# Altium footprint library THU VIEN PCB.PCBLib: 911 footprints (part 5 of 57)
Each footprint in its own frame and in the unit in brackets; x right, y up, seen from the top. Pads: shape width x height; smd on the part's side, far side on the other; paste and mask are expansions set on the pad; w line width, h text height; cw(c..) or ccw(c..) is an arc to the next point about the centre after c.
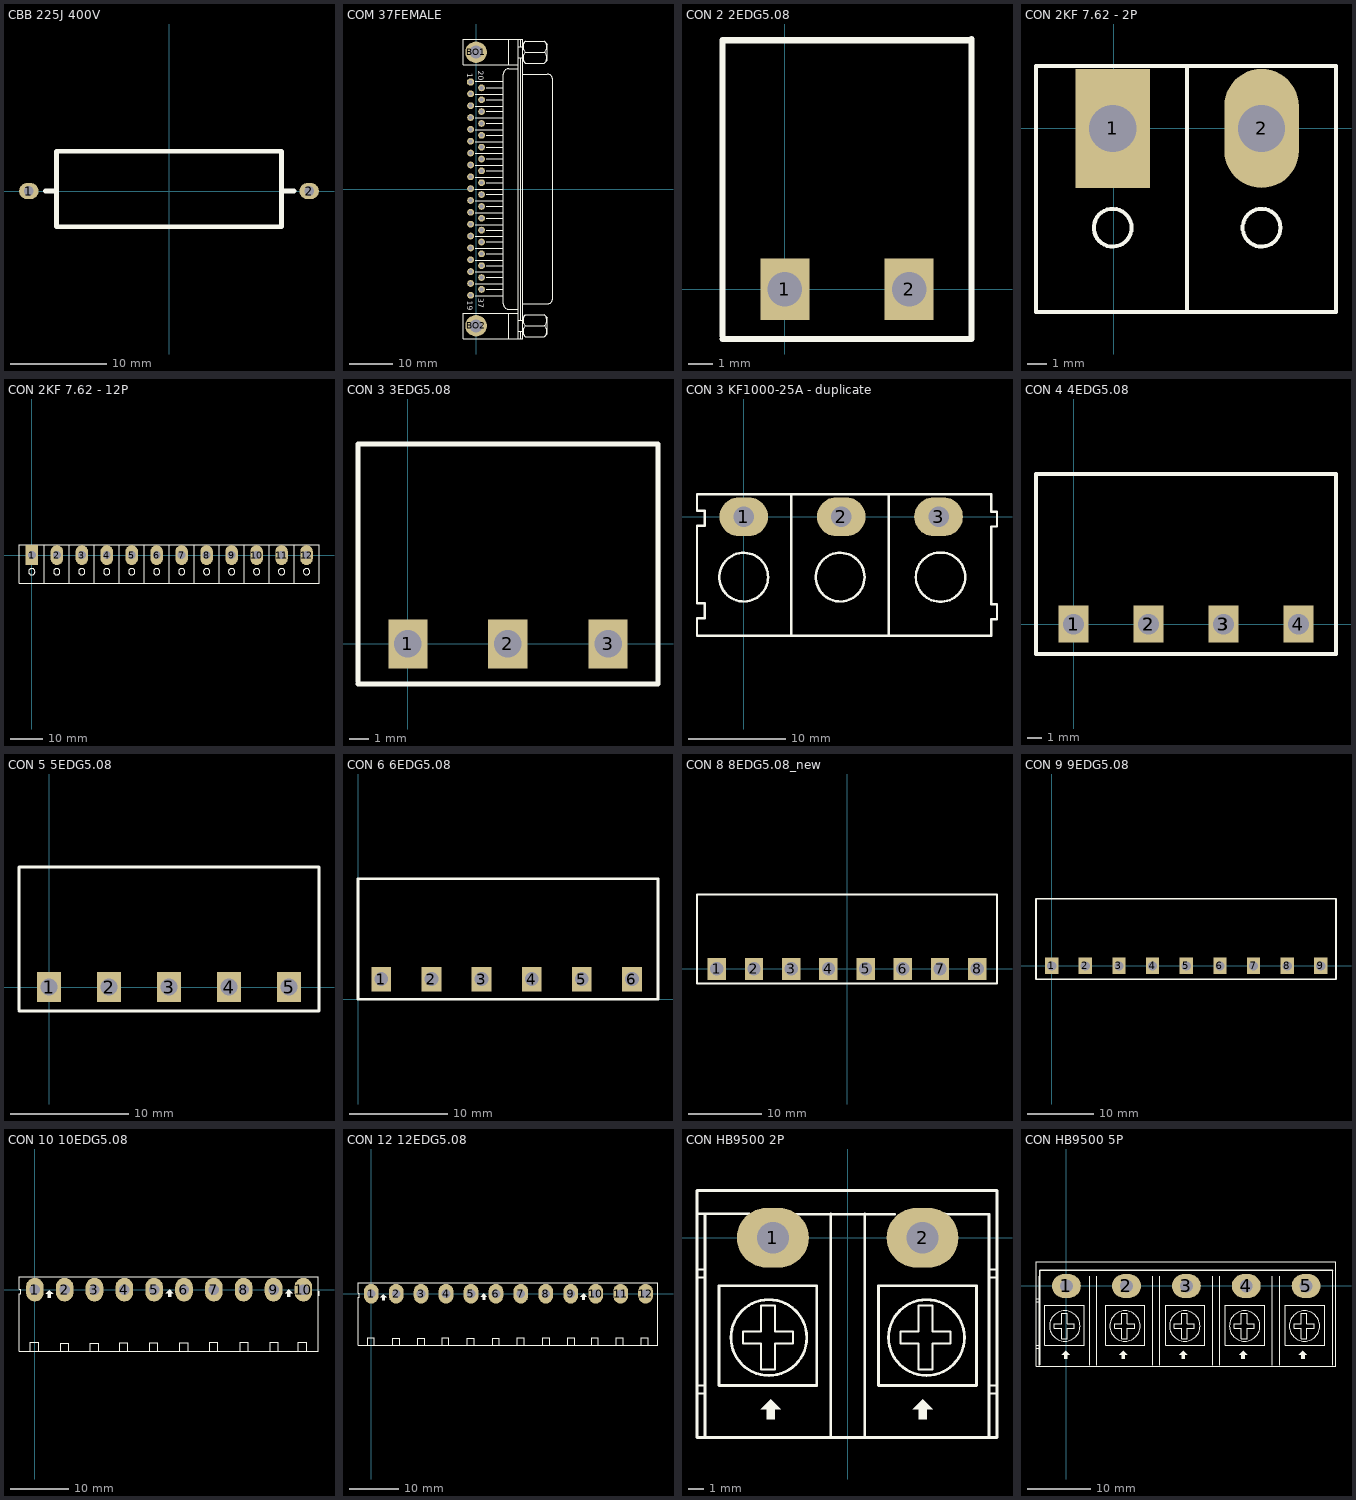
[diagram p4: the footprints below, top view; thin cyan lines are the x and y axes]

## CBB 225J 400V [mil]
pads (2):
  oval 80x65 hole 40: 1(-573.5,0) 2(573.5,0)
Top Overlay:
  lines w20: -504.5,1 -460.5,1 ; 462.5,0 510.5,0 ; -459.9,-146 -459.9,163 460.5,163 460.5,-146 -459.9,-146

## COM 37FEMALE [mil] "COM 37"
pads (39):
  oct 62x62 hole 35: 1(-50,978.33)
  round 62 hole 35: 2(-50,870) 3(-50,761.67) 4(-50,653.33) 5(-50,545) 6(-50,436.67) 7(-50,328.33) 8(-50,220) 9(-50,111.67) 10(-50,3.33) 11(-50,-105) 12(-50,-213.33) 13(-50,-321.67) 14(-50,-430) 15(-50,-538.33) 16(-50,-646.67) 17(-50,-755) 18(-50,-863.33) 19(-50,-971.67) 20(50,924.17) 21(50,815.83) 22(50,707.5) 23(50,599.17) 24(50,490.83) 25(50,382.5) 26(50,274.17) 27(50,165.83) 28(50,57.5) 29(50,-50.83) 30(50,-159.17) 31(50,-267.5) 32(50,-375.83) 33(50,-484.17) 34(50,-592.5) 35(50,-700.83) 36(50,-809.17) 37(50,-917.5)
  round 196.67 hole 118.33: BO1(0,1250) BO2(0,-1250)
Top Overlay:
  lines w8: -8.33,-975 241.67,-975 250,-975 ; -8.33,-866.67 241.67,-866.67 250,-866.67 ; -8.33,-758.33 241.67,-758.33 250,-758.33 ; -8.33,-650 241.67,-650 250,-650 ; -8.33,-541.67 241.67,-541.67 250,-541.67 ; -8.33,-433.33 241.67,-433.33 250,-433.33 ; -8.33,-325 241.67,-325 250,-325 ; -8.33,-216.67 241.67,-216.67 250,-216.67 ; -8.33,-108.33 250,-108.33 ; -8.33,0 250,0 ; -8.33,108.33 241.67,108.33 250,108.33 ; -8.33,216.67 241.67,216.67 250,216.67 ; -8.33,325 241.67,325 250,325 ; -8.33,433.33 241.67,433.33 250,433.33 ; -8.33,541.67 241.67,541.67 250,541.67 ; -8.33,650 241.67,650 250,650 ; -8.33,758.33 241.67,758.33 250,758.33 ; -8.33,866.67 241.67,866.67 250,866.67 ; -8.33,983.33 250,983.33 ; 91.67,-916.67 250,-916.67 ; 91.67,-808.33 250,-808.33 ; 91.67,-700 250,-700 ; 91.67,-591.67 250,-591.67 ; 91.67,-483.33 250,-483.33 ; 91.67,-375 250,-375 ; 91.67,-266.67 250,-266.67 ; 91.67,-158.33 250,-158.33 ; 91.67,-50 250,-50 ; 91.67,58.33 250,58.33 ; 91.67,166.67 250,166.67 ; 91.67,275 250,275 ; 91.67,383.33 250,383.33 ; 91.67,491.67 250,491.67 ; 91.67,600 250,600 ; 91.67,708.33 250,708.33 ; 91.67,816.67 250,816.67 ; 91.67,925 250,925 ; 300,-1366.67 300,-1133.33 ; 300,1133.33 300,1366.67 ; 383.33,-1366.67 383.33,1366.67 ; 383.33,-1300 425,-1300 ; 383.33,-1200 425,-1200 ; 383.33,-1133.33 -116.67,-1133.33 -116.67,-1366.67 425,-1366.67 425,1366.67 -116.67,1366.67 -116.67,1133.33 383.33,1133.33 ; 383.33,-1100 300,-1100 cw(c300,-1050) 250,-1050 250,1050 cw(c300,1050) 300,1100 383.33,1100 ; 383.33,1200 425,1200 ; 383.33,1300 425,1300 ; 408.33,-1366.67 408.33,-1300 ; 408.33,-1200 408.33,1200 ; 408.33,1300 408.33,1366.67 ; 425,-1325 450,-1350 625,-1350 650,-1325 650,-1175 625,-1150 450,-1150 425,-1175 ; 425,-1050 650,-1050 ccw(c650,-1000) 700,-1000 700,1000 ccw(c650,1000) 650,1050 425,1050 ; 425,1175 450,1150 625,1150 650,1175 650,1325 625,1350 450,1350 425,1325 ; 449.91,-1350.09 cw(c500,-1300) 449.91,-1249.91 ; 449.91,-1250.09 cw(c500,-1200) 449.91,-1149.91 ; 449.91,1149.91 cw(c500,1200) 449.91,1250.09 ; 449.91,1249.91 cw(c500,1300) 449.91,1350.09 ; 450,-1250 625,-1250 ; 450,1250 625,1250 ; 625.09,-1350.09 ccw(c575,-1300) 625.09,-1249.91 ; 625.09,-1250.09 ccw(c575,-1200) 625.09,-1149.91 ; 625.09,1149.91 ccw(c575,1200) 625.09,1250.09 ; 625.09,1249.91 ccw(c575,1300) 625.09,1350.09
  text "20" at 20,1080 h50
  text "19" at -80,-1020 h50
  text "37" at 20,-1000 h50
  text "1" at -80,1060 h50

## CON 2 2EDG5.08 [mm]
pads (2):
  rect 2x2.5 hole 1.4: 1(0,0) 2(5.08,0)
Top Overlay:
  lines w0.254: -2.54,-2.032 7.62,-2.032 7.62,10.211 ; -2.54,-1.905 -2.54,10.173 ; -2.54,10.16 7.62,10.16
3D body "User Library-BigHeader 5EHDR_1P.step": height 3.15, standoff -9.32, extent 2.58,-1.75 7.58,10.25
3D body "User Library-BigHeader 5EHDR_1P.step": height 3.15, standoff -9.32, extent -2.5,-1.75 2.5,10.25

## CON 2KF 7.62 - 2P [mil]
pads (2):
  rect 150x240 hole 95: 1(-2,0)
  oval 150x240 hole 95: 2(298,0)
Top Overlay:
  circle w8: c-2,-200 r38.08
  circle w8: c298,-200 r38.08
  lines w7.87: 148,-368.06 148,126 ; -156.54,-370 -156.54,-339.27 -156.54,126 448,126 448,-370 -156.54,-370
3D body "Con 2 KF7.62.step": height 492.61, standoff -245.58, extent -152,-370 448,122.12

## CON 2KF 7.62 - 12P [mil]
pads (12):
  rect 150x240 hole 95: 1(0,0)
  oval 150x240 hole 95: 2(300,0) 3(600,0) 4(900,0) 5(1200,0) 6(1500,0) 7(1800,0) 8(2100,0) 9(2400,0) 10(2700,0) 11(3000,0) 12(3300,0)
Top Overlay:
  circle w8: c0,-200 r38.08
  circle w8: c300,-200 r38.08
  circle w8: c3300,-200 r38.08
  circle w8: c3000,-200 r38.08
  circle w8: c2700,-200 r38.08
  circle w8: c2400,-200 r38.08
  circle w8: c2100,-200 r38.08
  circle w8: c1800,-200 r38.08
  circle w8: c1500,-200 r38.08
  circle w8: c1200,-200 r38.08
  circle w8: c900,-200 r38.08
  circle w8: c600,-200 r38.08
  lines w7.87: 150,-340.06 150,125 ; 450,-340.06 450,125 ; 454.7,125 -154.54,125 -154.54,-339.27 -154.54,-339.67 3450,-339.67 3450,125 455.12,125 ; 750,-340.06 750,125 ; 1050,-340.06 1050,125 ; 1350,-340.06 1350,125 ; 1650,-340.06 1650,125 ; 1950,-340.06 1950,125 ; 2250,-340.06 2250,125 ; 2550,-340.06 2550,125 ; 2850,-340.06 2850,125 ; 3150,-340.06 3150,125
3D body "Con 2 KF7.62.step": height 492.61, standoff -245.58, extent -150,-370 450,122.12
3D body "Con 2 KF7.62.step": height 492.61, standoff -245.58, extent 450,-370 1050,122.12
3D body "Con 2 KF7.62.step": height 492.61, standoff -245.58, extent 2850,-370 3450,122.12
3D body "Con 2 KF7.62.step": height 492.61, standoff -245.58, extent 2250,-370 2850,122.12
3D body "Con 2 KF7.62.step": height 492.61, standoff -245.58, extent 1650,-370 2250,122.12
3D body "Con 2 KF7.62.step": height 492.61, standoff -245.58, extent 1050,-370 1650,122.12

## CON 3 3EDG5.08 [mm]
pads (3):
  rect 2x2.5 hole 1.4: 1(0,0) 2(5.08,0) 3(10.173,0)
Top Overlay:
  lines w0.254: -2.54,-2.032 12.713,-2.032 12.713,10.16 -2.54,10.16 -2.54,-1.905
3D body "User Library-BigHeader 5EHDR_1P.step": height 3.15, standoff -9.32, extent -2.5,-1.75 2.5,10.25
3D body "User Library-BigHeader 5EHDR_1P.step": height 3.15, standoff -9.32, extent 2.593,-1.75 7.593,10.25
3D body "User Library-BigHeader 5EHDR_1P.step": height 3.15, standoff -9.32, extent 7.673,-1.75 12.673,10.25

## CON 3 KF1000-25A - duplicate [mm]
pads (3):
  oval 5x4 hole 2.1: 1(0,0) 2(10,0) 3(20,0)
Top Overlay:
  circle w0.254: c0,-6.2 r2.5
  circle w0.254: c9.9,-6.2 r2.5
  circle w0.254: c20.2,-6.2 r2.532
  lines w0.254: 4.9,-12.2 4.9,2.2 ; 14.9,-12.2 14.9,2.3 ; -4.8,-12.2 25.4,-12.2 25.4,-10.5 26,-10.5 26,-9 25.4,-9 25.4,-1 26,-1 26,0.5 25.4,0.5 25.4,2.3 -4.8,2.3 -4.8,0.6 -4,0.6 -4,-0.9 -4.8,-0.9 -4.8,-8.9 -4,-8.9 -4,-10.4 -4.8,-10.4 -4.8,-12.2

## CON 4 4EDG5.08 [mm]
pads (7):
  rect 2x2.5 hole 1.4: 1(0,0) 1(0,0) 2(5.08,0) 2(5.08,0) 3(10.16,0) 3(10.173,0) 4(15.24,0)
Top Overlay:
  lines w0.254: 12.713,-2.032 -2.54,-2.032 7.62,-2.032 17.78,-2.032 17.78,10.173 -2.527,10.173 -2.54,10.173 -2.54,-1.905 -2.54,10.16 ; 12.713,10.16 -2.54,10.16 ; 17.78,10.16 -2.54,10.16
3D body "User Library-BigHeader 5EHDR_1P.step": height 3.15, standoff -9.32, extent 12.74,-1.75 17.74,10.25
3D body "User Library-BigHeader 5EHDR_1P.step": height 3.15, standoff -9.32, extent 7.66,-1.75 12.66,10.25
3D body "User Library-BigHeader 5EHDR_1P.step": height 3.15, standoff -9.32, extent 2.58,-1.75 7.58,10.25
3D body "User Library-BigHeader 5EHDR_1P.step": height 3.15, standoff -9.32, extent -2.5,-1.75 2.5,10.25

## CON 5 5EDG5.08 [mm]
pads (5):
  rect 2x2.5 hole 1.4: 1(0,0) 2(5.08,0) 3(10.16,0) 4(15.24,0) 5(20.32,0)
Top Overlay:
  lines w0.254: -2.54,-2.032 7.62,-2.032 22.86,-2.032 22.86,10.16 ; -2.54,-1.905 -2.54,10.16 ; -2.54,10.16 22.86,10.16 ; -2.54,10.16 6.248,10.16 22.86,10.16
3D body "User Library-BigHeader 5EHDR_1P.step": height 3.15, standoff -9.32, extent -2.5,-1.75 2.5,10.25
3D body "User Library-BigHeader 5EHDR_1P.step": height 3.15, standoff -9.32, extent 2.58,-1.75 7.58,10.25
3D body "User Library-BigHeader 5EHDR_1P.step": height 3.15, standoff -9.32, extent 7.66,-1.75 12.66,10.25
3D body "User Library-BigHeader 5EHDR_1P.step": height 3.15, standoff -9.32, extent 12.74,-1.75 17.74,10.25
3D body "User Library-BigHeader 5EHDR_1P.step": height 3.15, standoff -9.32, extent 17.82,-1.75 22.82,10.25

## CON 6 6EDG5.08 [mm]
pads (6):
  rect 2x2.5 hole 1.4: 1(2.362,2.057) 2(7.442,2.057) 3(12.522,2.057) 4(17.602,2.057) 5(22.682,2.057) 6(27.762,2.057)
Top Overlay:
  lines w0.254: 16.205,12.217 30.404,12.217 30.404,0.025 30.302,0.025 20.142,0.025 9.982,0.025 0,0.025 0,12.217 20.142,12.217
3D body "User Library-BigHeader 5EHDR_1P.step": height 3.15, standoff -9.32, extent -0.138,0.308 4.862,12.308
3D body "User Library-BigHeader 5EHDR_1P.step": height 3.15, standoff -9.32, extent 4.942,0.308 9.942,12.308
3D body "User Library-BigHeader 5EHDR_1P.step": height 3.15, standoff -9.32, extent 10.022,0.308 15.022,12.308
3D body "User Library-BigHeader 5EHDR_1P.step": height 3.15, standoff -9.32, extent 15.102,0.308 20.102,12.308
3D body "User Library-BigHeader 5EHDR_1P.step": height 3.15, standoff -9.32, extent 20.182,0.308 25.182,12.308
3D body "User Library-BigHeader 5EHDR_1P.step": height 3.15, standoff -9.32, extent 25.262,0.308 30.262,12.308

## CON 8 8EDG5.08_new [mm]
pads (8):
  rect 2.5x3 hole 1.8: 1(-17.78,0) 2(-12.7,0) 3(-7.62,0) 4(-2.54,0) 5(2.54,0) 6(7.62,0) 7(12.7,0) 8(17.78,0)
Top Overlay:
  lines w0.254: -3.937,10.16 20.475,10.16 20.475,-2.032 10.16,-2.032 0,-2.032 -10.16,-2.032 -20.475,-2.032 -20.475,10.16 0,10.16
3D body "User Library-BigHeader 5EHDR_1P.step": height 3.15, standoff -9.32, extent -20.28,-1.75 -15.28,10.25
3D body "User Library-BigHeader 5EHDR_1P.step": height 3.15, standoff -9.32, extent -15.2,-1.75 -10.2,10.25
3D body "User Library-BigHeader 5EHDR_1P.step": height 3.15, standoff -9.32, extent -10.12,-1.75 -5.12,10.25
3D body "User Library-BigHeader 5EHDR_1P.step": height 3.15, standoff -9.32, extent -5.04,-1.75 -0.04,10.25
3D body "User Library-BigHeader 5EHDR_1P.step": height 3.15, standoff -9.32, extent 0.04,-1.75 5.04,10.25
3D body "User Library-BigHeader 5EHDR_1P.step": height 3.15, standoff -9.32, extent 5.12,-1.75 10.12,10.25
3D body "User Library-BigHeader 5EHDR_1P.step": height 3.15, standoff -9.32, extent 10.2,-1.75 15.2,10.25
3D body "User Library-BigHeader 5EHDR_1P.step": height 3.15, standoff -9.32, extent 15.28,-1.75 20.28,10.25

## CON 9 9EDG5.08 [mm]
pads (9):
  rect 2x2.5 hole 1.4: 1(0,0) 2(5.08,0) 3(10.16,0) 4(15.24,0) 5(20.32,0) 6(25.4,0) 7(30.48,0) 8(35.56,0) 9(40.64,0)
Top Overlay:
  lines w0.254: 13.843,10.16 42.926,10.16 42.926,-2.032 27.94,-2.032 17.78,-2.032 7.62,-2.032 -2.362,-2.032 -2.362,10.16 17.78,10.16
3D body "User Library-BigHeader 5EHDR_1P.step": height 3.15, standoff -9.32, extent 33.06,-1.75 38.06,10.25
3D body "User Library-BigHeader 5EHDR_1P.step": height 3.15, standoff -9.32, extent 27.98,-1.75 32.98,10.25
3D body "User Library-BigHeader 5EHDR_1P.step": height 3.15, standoff -9.32, extent 22.9,-1.75 27.9,10.25
3D body "User Library-BigHeader 5EHDR_1P.step": height 3.15, standoff -9.32, extent 17.82,-1.75 22.82,10.25
3D body "User Library-BigHeader 5EHDR_1P.step": height 3.15, standoff -9.32, extent 12.74,-1.75 17.74,10.25
3D body "User Library-BigHeader 5EHDR_1P.step": height 3.15, standoff -9.32, extent 7.66,-1.75 12.66,10.25
3D body "User Library-BigHeader 5EHDR_1P.step": height 3.15, standoff -9.32, extent 2.58,-1.75 7.58,10.25
3D body "User Library-BigHeader 5EHDR_1P.step": height 3.15, standoff -9.32, extent -2.5,-1.75 2.5,10.25
3D body "User Library-BigHeader 5EHDR_1P.step": height 3.15, standoff -9.32, extent 38.14,-1.75 43.14,10.25

## CON 10 10EDG5.08 [mm]
pads (10):
  oval 3x4 hole 1.778: 1(0,0) 2(5.08,0) 3(10.16,0) 4(15.24,0) 5(20.32,0) 6(25.4,0) 7(30.48,0) 8(35.56,0) 9(40.645,0) 10(45.73,0)
Top Overlay:
  region: 2.489,-0.076 3.124,-0.711 2.743,-0.711 2.743,-1.346 2.235,-1.346 2.235,-0.711 1.854,-0.711
  region: 22.936,0.051 23.571,-0.584 23.19,-0.584 23.19,-1.219 22.682,-1.219 22.682,-0.584 22.301,-0.584
  region: 43.256,0.051 43.891,-0.584 43.51,-0.584 43.51,-1.219 43.002,-1.219 43.002,-0.584 42.621,-0.584
  lines w0.178: -0.737,-10.389 -0.737,-8.992 0.66,-8.992 0.66,-10.389 ; 4.42,-10.49 4.42,-9.093 5.817,-9.093 5.817,-10.49 ; 9.474,-10.49 9.474,-9.093 10.871,-9.093 10.871,-10.49 ; 14.427,-10.414 14.427,-9.017 15.824,-9.017 15.824,-10.414 ; 19.558,-10.465 19.558,-9.068 20.955,-9.068 20.955,-10.465 ; 24.714,-10.465 24.714,-9.068 26.111,-9.068 26.111,-10.465 ; 29.769,-10.363 29.769,-8.966 31.166,-8.966 31.166,-10.363 ; 34.976,-10.389 34.976,-8.992 36.373,-8.992 36.373,-10.389 ; 40.056,-10.389 40.056,-8.992 41.453,-8.992 41.453,-10.389 ; 44.882,-10.389 44.882,-8.992 46.279,-8.992 46.279,-10.389 ; 48.387,-1.016 48.387,-0.254 ; -2.692,0.051 -2.388,0.051 -2.388,-0.711 -2.667,-0.711 -2.667,-10.49 48.26,-10.49 48.26,2.21 -2.692,2.21 -2.692,0.051
3D body "User Library-BigHeader 5EHDR_1P.step": height 3.24, standoff -9.23, extent -2.54,-10.318 2.46,1.682
3D body "User Library-BigHeader 5EHDR_1P.step": height 3.24, standoff -9.23, extent 2.54,-10.318 7.54,1.682
3D body "User Library-BigHeader 5EHDR_1P.step": height 3.24, standoff -9.23, extent 7.62,-10.318 12.62,1.682
3D body "User Library-BigHeader 5EHDR_1P.step": height 3.24, standoff -9.23, extent 12.7,-10.318 17.7,1.682
3D body "User Library-BigHeader 5EHDR_1P.step": height 3.24, standoff -9.23, extent 17.78,-10.318 22.78,1.682
3D body "User Library-BigHeader 5EHDR_1P.step": height 3.24, standoff -9.23, extent 22.86,-10.318 27.86,1.682
3D body "User Library-BigHeader 5EHDR_1P.step": height 3.24, standoff -9.23, extent 27.94,-10.318 32.94,1.682
3D body "User Library-BigHeader 5EHDR_1P.step": height 3.24, standoff -9.23, extent 33.02,-10.318 38.02,1.682
3D body "User Library-BigHeader 5EHDR_1P.step": height 3.24, standoff -9.23, extent 38.1,-10.318 43.1,1.682
3D body "User Library-BigHeader 5EHDR_1P.step": height 3.24, standoff -9.23, extent 43.18,-10.318 48.18,1.682

## CON 12 12EDG5.08 [mm]
pads (12):
  oval 3x4 hole 1.778: 1(0,0) 2(5.08,0) 3(10.16,0) 4(15.24,0) 5(20.32,0) 6(25.4,0) 7(30.48,0) 8(35.56,0) 9(40.645,0) 10(45.73,0) 11(50.81,0) 12(55.89,0)
Top Overlay:
  region: 43.256,0.051 43.891,-0.584 43.51,-0.584 43.51,-1.219 43.002,-1.219 43.002,-0.584 42.621,-0.584
  region: 22.936,0.051 23.571,-0.584 23.19,-0.584 23.19,-1.219 22.682,-1.219 22.682,-0.584 22.301,-0.584
  region: 2.489,-0.076 3.124,-0.711 2.743,-0.711 2.743,-1.346 2.235,-1.346 2.235,-0.711 1.854,-0.711
  lines w0.178: -0.737,-10.389 -0.737,-8.992 0.66,-8.992 0.66,-10.389 ; 4.42,-10.49 4.42,-9.093 5.817,-9.093 5.817,-10.49 ; 9.474,-10.49 9.474,-9.093 10.871,-9.093 10.871,-10.49 ; 14.427,-10.414 14.427,-9.017 15.824,-9.017 15.824,-10.414 ; 19.558,-10.465 19.558,-9.068 20.955,-9.068 20.955,-10.465 ; 24.714,-10.465 24.714,-9.068 26.111,-9.068 26.111,-10.465 ; 29.769,-10.363 29.769,-8.966 31.166,-8.966 31.166,-10.363 ; 34.976,-10.389 34.976,-8.992 36.373,-8.992 36.373,-10.389 ; 40.056,-10.389 40.056,-8.992 41.453,-8.992 41.453,-10.389 ; 44.882,-10.389 44.882,-8.992 46.279,-8.992 46.279,-10.389 ; 49.962,-10.389 49.962,-8.992 51.359,-8.992 51.359,-10.389 ; 55.042,-10.389 55.042,-8.992 56.439,-8.992 56.439,-10.389 ; 58.42,-1.016 58.42,-0.254 ; -2.692,0.051 -2.692,2.21 58.42,2.21 58.42,-10.49 -2.667,-10.49 -2.667,-0.711 -2.388,-0.711 -2.388,0.051 -2.692,0.051
3D body "User Library-BigHeader 5EHDR_1P.step": height 3.24, standoff -9.23, extent 53.34,-10.293 58.34,1.707
3D body "User Library-BigHeader 5EHDR_1P.step": height 3.24, standoff -9.23, extent 48.26,-10.293 53.26,1.707
3D body "User Library-BigHeader 5EHDR_1P.step": height 3.24, standoff -9.23, extent 43.18,-10.318 48.18,1.682
3D body "User Library-BigHeader 5EHDR_1P.step": height 3.24, standoff -9.23, extent 38.1,-10.318 43.1,1.682
3D body "User Library-BigHeader 5EHDR_1P.step": height 3.24, standoff -9.23, extent 33.02,-10.318 38.02,1.682
3D body "User Library-BigHeader 5EHDR_1P.step": height 3.24, standoff -9.23, extent 27.94,-10.318 32.94,1.682
3D body "User Library-BigHeader 5EHDR_1P.step": height 3.24, standoff -9.23, extent 22.86,-10.318 27.86,1.682
3D body "User Library-BigHeader 5EHDR_1P.step": height 3.24, standoff -9.23, extent 17.78,-10.318 22.78,1.682
3D body "User Library-BigHeader 5EHDR_1P.step": height 3.24, standoff -9.23, extent 12.7,-10.318 17.7,1.682
3D body "User Library-BigHeader 5EHDR_1P.step": height 3.24, standoff -9.23, extent 7.62,-10.318 12.62,1.682
3D body "User Library-BigHeader 5EHDR_1P.step": height 3.24, standoff -9.23, extent 2.54,-10.318 7.54,1.682
3D body "User Library-BigHeader 5EHDR_1P.step": height 3.24, standoff -9.23, extent -2.54,-10.318 2.46,1.682

## CON HB9500 2P [mil] "Header 2: 300V-20A, 2 pin, hight 300mil, Pin to Pin 400, Colour Green"
height 300
pads (2):
  oval 180x150 hole 80: 1(-187.5,0) 2(187.5,0)
Top Overlay:
  circle w7: c197.5,-250 r95
  circle w7: c-197.5,-250 r95
  region: 187.5,-405 162.5,-430 177.5,-430 177.5,-455 197.5,-455 197.5,-430 212.5,-430
  region: -192.5,-405 -217.5,-430 -202.5,-430 -202.5,-455 -182.5,-455 -182.5,-430 -167.5,-430
  lines w5: -375,-390 -360,-390 ; -375,-370 -360,-370 ; -375,-100 -360,-100 ; -375,-80 -360,-80 ; 355,-390 370,-390 ; 355,-370 370,-370 ; 355,-100 370,-100 ; 355,-80 370,-80 ; -262.5,-265 -262.5,-235 -217.5,-235 -217.5,-170 -182.5,-170 -182.5,-235 -137.5,-235 -137.5,-265 -182.5,-265 -182.5,-330 -217.5,-330 -217.5,-265 -262.5,-265 ; 132.5,-265 132.5,-235 177.5,-235 177.5,-170 212.5,-170 212.5,-235 257.5,-235 257.5,-265 212.5,-265 212.5,-330 177.5,-330 177.5,-265 132.5,-265
  lines w7: -377.5,60 -247.5,60 ; -357.5,-495 -357.5,60 ; -131.89,59.06 118.11,59.06 ; -42.5,-495 -42.5,60 ; 42.5,-495 42.5,60 ; 242.5,60 242.5,59.13 354.33,59.04 354.33,-495 ; -377.5,-500 -377.5,118.11 374.02,118.11 374.02,-500 -377.5,-500 ; -322.5,-370 -77.5,-370 -77.5,-120 -322.5,-120 -322.5,-370 ; 77.5,-370 322.5,-370 322.5,-120 77.5,-120 77.5,-370
3D body "CON 2 HB.stp": height 500.6, standoff -199.4, extent -366,-485 345,115

## CON HB9500 5P [mil]
pads (5):
  oval 180x150 hole 80: 1(0,0) 2(375,0) 3(749.02,0) 4(1123.03,0) 5(1497.05,0)
Top Overlay:
  circle w7: c1487.36,-250 r95
  circle w7: c1113.35,-250 r95
  circle w7: c739.33,-250 r95
  circle w7: c365.31,-250 r95
  circle w7: c-10,-250 r95
  region: 1477.36,-405 1452.36,-430 1467.36,-430 1467.36,-455 1487.36,-455 1487.36,-430 1502.36,-430
  region: 1103.35,-405 1078.35,-430 1093.35,-430 1093.35,-455 1113.35,-455 1113.35,-430 1128.35,-430
  region: 729.33,-405 704.33,-430 719.33,-430 719.33,-455 739.33,-455 739.33,-430 754.33,-430
  region: 355.31,-405 330.31,-430 345.31,-430 345.31,-455 365.31,-455 365.31,-430 380.31,-430
  region: -5,-405 -30,-430 -15,-430 -15,-455 5,-455 5,-430 20,-430
  lines w5: -187.5,-390 -172.5,-390 ; -187.5,-370 -172.5,-370 ; -187.5,-100 -172.5,-100 ; -187.5,-80 -172.5,-80 ; -75,-265 -75,-235 -30,-235 -30,-170 5,-170 5,-235 50,-235 50,-265 5,-265 5,-330 -30,-330 -30,-265 -75,-265 ; 300.31,-265 345.31,-265 345.31,-330 380.31,-330 380.31,-265 425.31,-265 425.31,-235 380.31,-235 380.31,-170 345.31,-170 345.31,-235 300.31,-235 300.31,-265 ; 674.33,-265 719.33,-265 719.33,-330 754.33,-330 754.33,-265 799.33,-265 799.33,-235 754.33,-235 754.33,-170 719.33,-170 719.33,-235 674.33,-235 674.33,-265 ; 1048.35,-265 1093.35,-265 1093.35,-330 1128.35,-330 1128.35,-265 1173.35,-265 1173.35,-235 1128.35,-235 1128.35,-170 1093.35,-170 1093.35,-235 1048.35,-235 1048.35,-265 ; 1422.36,-265 1467.36,-265 1467.36,-330 1502.36,-330 1502.36,-265 1547.36,-265 1547.36,-235 1502.36,-235 1502.36,-170 1467.36,-170 1467.36,-235 1422.36,-235 1422.36,-265
  lines w7: -170,-495 -170,60 ; 145,-495 145,60 ; 190.63,-495 190.63,60 ; 538.7,-495 538.7,60 ; 584.33,-495 584.33,60 ; 912.72,-495 912.72,60 ; 958.35,-495 958.35,60 ; 1286.73,-495 1286.73,60 ; 1332.36,-495 1332.36,60 ; 1662.05,-495 1662.05,97.49 ; -190,-500 -190,150 1683.56,150 1683.56,-500 -190,-500 ; -135,-370 110,-370 110,-120 -135,-120 -135,-370 ; 245.31,-370 245.31,-120 490.31,-120 490.31,-370 245.31,-370 ; 619.33,-370 619.33,-120 864.33,-120 864.33,-370 619.33,-370 ; 993.35,-370 993.35,-120 1238.35,-120 1238.35,-370 993.35,-370 ; 1367.36,-370 1367.36,-120 1612.36,-120 1612.36,-370 1367.36,-370
  lines w10: -166.83,-492.13 -166.83,98.43 1663.88,98.43